# Altium footprint library GZ7_1_x.PcbLib: 61 footprints (part 3 of 4)
Each footprint in its own frame and in the unit in brackets; x right, y up, seen from the top. Pads: shape width x height; smd on the part's side, far side on the other; paste and mask are expansions set on the pad; w line width, h text height; cw(c..) or ccw(c..) is an arc to the next point about the centre after c.
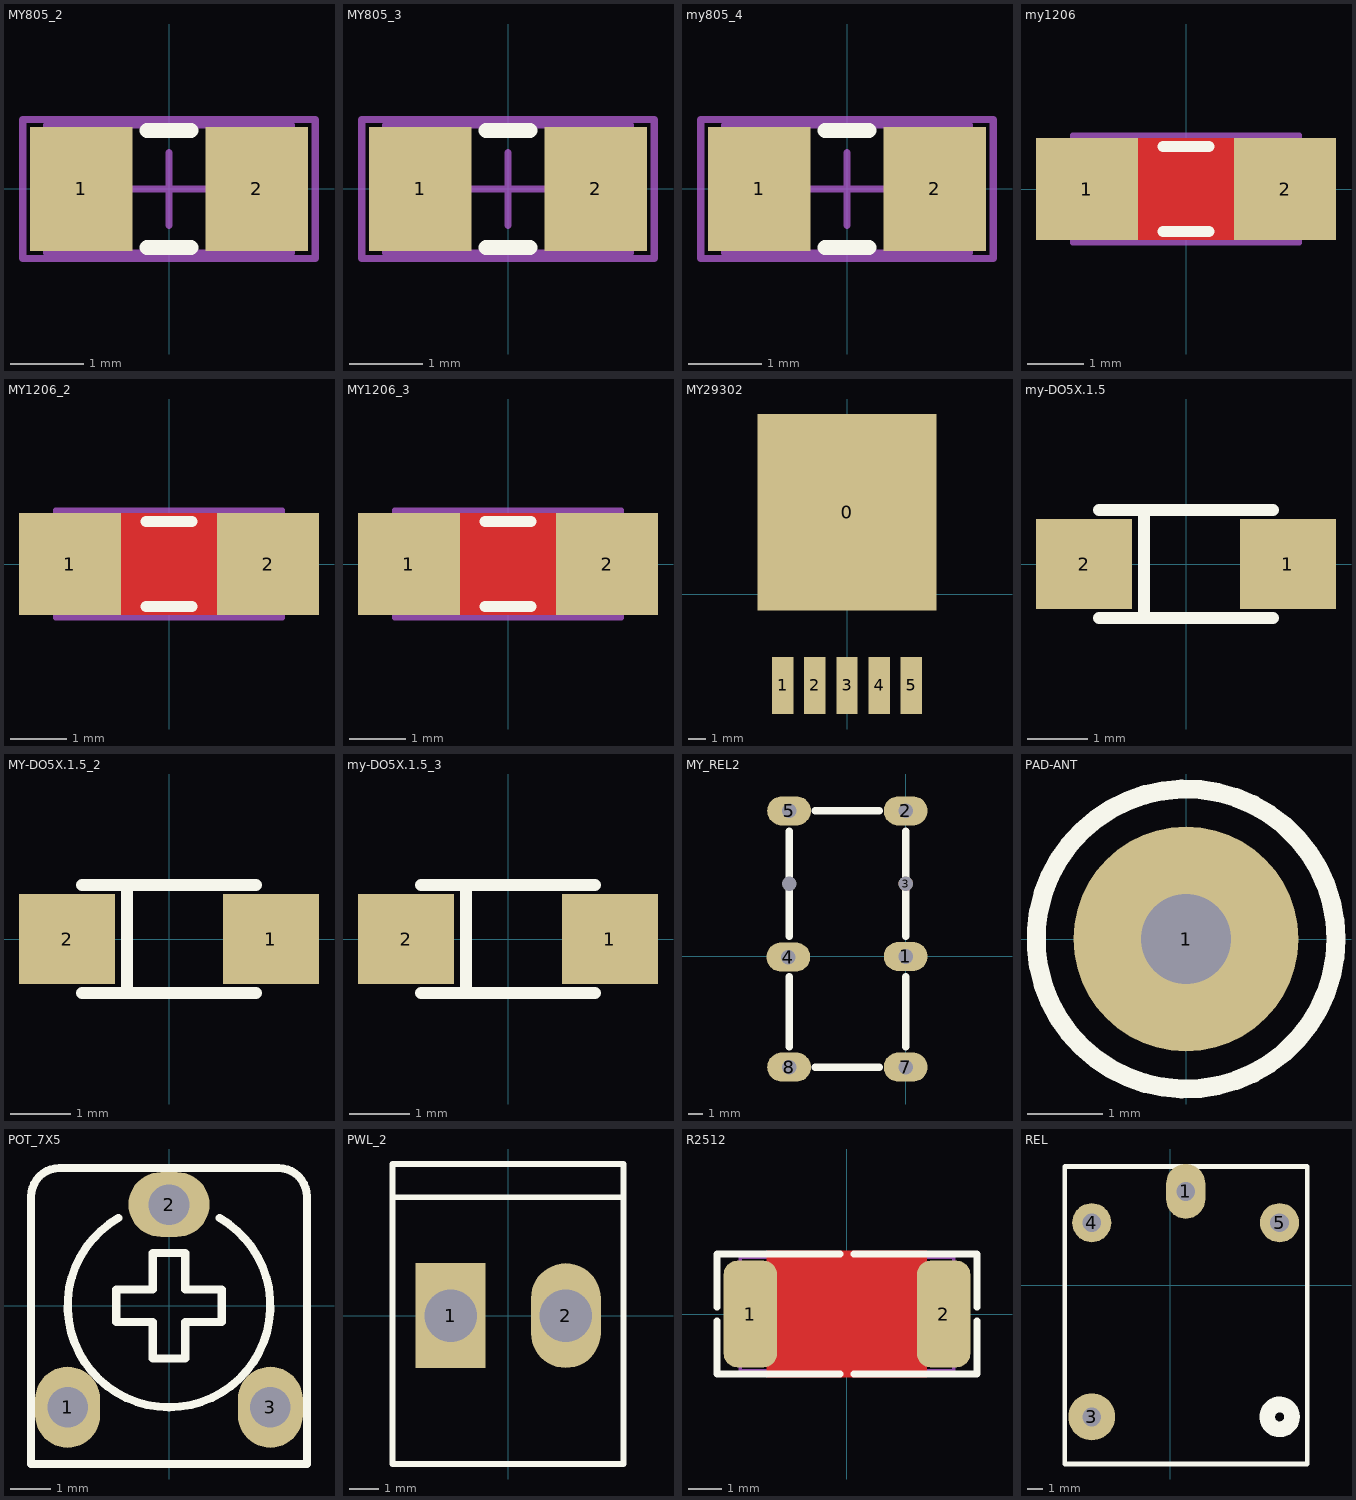
[diagram p2: the footprints below, top view; thin cyan lines are the x and y axes]

## MY805_2 [mm]
pads (2):
  rect 1.4x1.7 smd: 1(-1.2,0) 2(1.2,0)
Top Overlay:
  lines w0.2: -0.3,-0.8 0.3,-0.8 ; -0.3,0.8 0.3,0.8
Mechanical 13:
  lines w0.1: -1.675,-0.875 1.675,-0.875 1.675,0.875 -1.675,0.875 -1.675,-0.875
Mechanical 15:
  lines w0.1: -0.5,0 0.5,0 ; 0,-0.5 0,0.5 ; -2,-0.95 2,-0.95 2,0.95 -2,0.95 -2,-0.95
3D body "User Library-RES_2013-0805.STEP": height 0.77, standoff 0.01, extent -1.15,-0.675 1.15,0.675

## MY805_3 [mm]
pads (2):
  rect 1.4x1.7 smd: 1(-1.2,0) 2(1.2,0)
Top Overlay:
  lines w0.2: -0.3,-0.8 0.3,-0.8 ; -0.3,0.8 0.3,0.8
Mechanical 13:
  lines w0.1: -1.675,-0.875 1.675,-0.875 1.675,0.875 -1.675,0.875 -1.675,-0.875
Mechanical 15:
  lines w0.1: -0.5,0 0.5,0 ; 0,-0.5 0,0.5 ; -2,-0.95 2,-0.95 2,0.95 -2,0.95 -2,-0.95
3D body "User Library-RES_2013-0805.STEP": height 0.77, standoff 0.01, extent -1.15,-0.675 1.15,0.675

## my805_4 [mm]
pads (2):
  rect 1.4x1.7 smd: 1(-1.2,0) 2(1.2,0)
Top Overlay:
  lines w0.2: -0.3,-0.8 0.3,-0.8 ; -0.3,0.8 0.3,0.8
Mechanical 13:
  lines w0.1: -1.675,-0.875 -1.675,0.875 1.675,0.875 1.675,-0.875 -1.675,-0.875
Mechanical 15:
  lines w0.1: -0.5,0 0.5,0 ; 0,-0.5 0,0.5 ; -2,-0.95 -2,0.95 2,0.95 2,-0.95 -2,-0.95
3D body "User Library-RES_2013-0805.STEP": height 0.77, standoff 0.01, extent -1.15,-0.675 1.15,0.675

## my1206 [mm]
height 1.524
pads (2):
  rect 1.8x1.8 smd: 1(-1.75,0) 2(1.75,0)
Top Layer:
  pour cut-out: -1.2,0.9 1.2,0.9 1.2,-0.9 -1.2,-0.9
Top Overlay:
  lines w0.2: -0.4,-0.75 0.4,-0.75 ; -0.4,0.75 0.4,0.75
Mechanical 13:
  lines w0.1: -1.675,-0.875 1.675,-0.875 1.675,0.875 -1.675,0.875 -1.675,-0.875
Mechanical 15:
  lines w0.1: -0.5,0 0.5,0 ; 0,-0.5 0,0.5 ; -2,-0.95 2,-0.95 2,0.95 -2,0.95 -2,-0.95
3D body "end-el-san Co Ltd-R10-1206.STEP": height 0.55, standoff 0, extent -1.6,-0.8 1.6,0.8

## MY1206_2 [mm]
pads (2):
  rect 1.8x1.8 smd: 1(-1.75,0) 2(1.75,0)
Top Layer:
  pour cut-out: -1.2,0.9 1.2,0.9 1.2,-0.9 -1.2,-0.9
Top Overlay:
  lines w0.2: -0.4,-0.75 0.4,-0.75 ; -0.4,0.75 0.4,0.75
Mechanical 13:
  lines w0.1: -1.675,-0.875 -1.675,0.875 1.675,0.875 1.675,-0.875 -1.675,-0.875
Mechanical 15:
  lines w0.1: -0.5,0 0.5,0 ; 0,-0.5 0,0.5 ; -2,-0.95 -2,0.95 2,0.95 2,-0.95 -2,-0.95
3D body "end-el-san Co Ltd-R10-1206.STEP": height 0.55, standoff 0, extent -1.6,-0.8 1.6,0.8

## MY1206_3 [mm]
pads (2):
  rect 1.8x1.8 smd: 1(-1.75,0) 2(1.75,0)
Top Layer:
  pour cut-out: -1.2,0.9 1.2,0.9 1.2,-0.9 -1.2,-0.9
Top Overlay:
  lines w0.2: -0.4,-0.75 0.4,-0.75 ; -0.4,0.75 0.4,0.75
Mechanical 13:
  lines w0.1: -1.675,-0.875 1.675,-0.875 1.675,0.875 -1.675,0.875 -1.675,-0.875
Mechanical 15:
  lines w0.1: -0.5,0 0.5,0 ; 0,-0.5 0,0.5 ; -2,-0.95 2,-0.95 2,0.95 -2,0.95 -2,-0.95
3D body "end-el-san Co Ltd-R10-1206.STEP": height 0.55, standoff 0, extent -1.6,-0.8 1.6,0.8

## MY29302 [mm]
pads (6):
  rect 10x11 smd: 0(0,4.6)
  rect 1.2x3.2 smd: 1(-3.6,-5.1) 2(-1.8,-5.1) 3(0,-5.1) 4(1.8,-5.1) 5(3.6,-5.1)
3D body "MIC29302WU.STEP": height 4.41, standoff -0.14, extent -5.163,-6.42 5.137,8.808

## my-DO5X.1.5 [mm]
height 1.524
pads (2):
  rect 1.6x1.5 smd: 1(1.7,0) 2(-1.7,0)
Top Overlay:
  lines w0.2: -1.45,-0.9 1.45,-0.9 ; -1.45,0.9 1.45,0.9 ; -0.7,-0.9 -0.7,0.9
3D body "User Library-MiniMelf-2.STEP": height 1.6, standoff 0, extent -1.88,-0.8 1.82,0.8

## MY-DO5X.1.5_2 [mm]
pads (2):
  rect 1.6x1.5 smd: 1(1.7,0) 2(-1.7,0)
Top Overlay:
  lines w0.2: -1.45,-0.9 1.45,-0.9 ; -1.45,0.9 1.45,0.9 ; -0.7,-0.9 -0.7,0.9
3D body "User Library-MiniMelf-2.STEP": height 1.6, standoff 0, extent -1.88,-0.8 1.82,0.8

## my-DO5X.1.5_3 [mm]
pads (2):
  rect 1.6x1.5 smd: 1(1.7,0) 2(-1.7,0)
Top Overlay:
  lines w0.2: -1.45,-0.9 1.45,-0.9 ; -1.45,0.9 1.45,0.9 ; -0.7,-0.9 -0.7,0.9
3D body "User Library-MiniMelf-2.STEP": height 1.6, standoff 0, extent -1.88,-0.8 1.82,0.8

## MY_REL2 [mm]
height 1.524
pads (8):
  oval 3x2 hole 1: 1(0,0) 2(0,10) 4(-8.048,-0.044) 5(-8,10) 7(0,-7.6) 8(-8,-7.6)
  round 1 hole 1: 3(0,5)
  round 0 hole 1: 6(-8,5)
Top Overlay:
  lines w0.508: -8,-6.2 -8,-1.4 ; -8,1.4 -8,8.6 ; -6.2,-7.6 -1.8,-7.6 ; -6.2,10 -1.8,10 ; 0,-6.2 0,-1.4 ; 0,1.4 0,8.6
3D body "relays RSM822 6112-85-S012.STEP": height 11.44, standoff -4.69, extent -8.987,-8.849 1.113,12.151

## PAD-ANT [mm]
pads (1):
  round 3 hole 1.2: 1(0,0)
Top Overlay:
  circle w0.254: c0,0 r2
3D body "TEST POINT.step": height 6.51, standoff -2.99, extent -0.5,-0.5 0.5,0.5

## POT_7X5 [mm] "POT, TRIM, 7.5X5.0mm, pitch: 5.0mm"
height 35
pads (3):
  oval 1.6x2 hole 1 mask+0.08: 1(-2.5,-2.5) 3(2.5,-2.5)
  oval 2x1.6 hole 1 mask+0.08: 2(0,2.5)
Top Overlay:
  lines w0.2: -1.25,2.165 ccw(c0,0) 1.25,2.165 ; -3.4,-3.9 -3.4,2.7 cw(c-2.7,2.7) -2.7,3.4 2.7,3.4 cw(c2.7,2.7) 3.4,2.7 3.4,-3.9 -3.4,-3.9 ; -1.3,-0.4 -1.3,0.4 -0.4,0.4 -0.4,1.3 0.4,1.3 0.4,0.4 1.3,0.4 1.3,-0.4 0.4,-0.4 0.4,-1.3 -0.4,-1.3 -0.4,-0.4 -1.3,-0.4
3D body "User Library-Pot - RES_VAR1.STEP": height 7, standoff -3.9, extent -3.25,-3.775 3.25,3.275

## PWL_2 [mm] "Connector; Header; 2 Position"
height 0.001
pads (2):
  rect 2.4x3.6 hole 1.8: 1(-1.98,0)
  oval 2.4x3.6 hole 1.8: 2(1.98,0)
Top Overlay:
  lines w0.2: -3.98,4.064 3.96,4.064 ; -3.98,-5.1 3.96,-5.1 3.96,5.207 -3.98,5.207 -3.98,-5.1
3D body "PWL-2.stp": height 13.5, standoff -4, extent -3.96,-5 3.96,5

## R2512 [mm] "CHIP RESISTOR 1 WATT, 6.4X3.2mm, 2512, 6432"
height 1
pads (2):
  rrect50% 1.6x3.2 smd mask+0.08: 1(-2.9,0) 2(2.9,0)
Top Layer:
  pour cut-out: -2.4,1.9 2.4,1.9 2.4,-1.9 -2.4,-1.9
Top Overlay:
  lines w0.2: -3.9,-0.2 -3.9,-1.8 -0.2,-1.8 ; -3.9,0.2 -3.9,1.8 -0.2,1.8 ; 0.2,-1.8 3.9,-1.8 3.9,-0.2 ; 0.2,1.8 3.9,1.8 3.9,0.2
Mechanical 13:
  lines w0.1: -3.2,-1.7 3.2,-1.7 3.2,1.7 -3.2,1.7 -3.2,-1.7
3D body "User Library-2512 SMD Resistor.step": height 1.6, standoff 0, extent -3.175,-1.5 3.175,1.5

## REL [mm]
pads (4):
  oval 2.5x3.5 hole 1.2 mask+0.2: 1(0.993,6.009)
  round 3 hole 1.2 mask+0.2: 3(-5.007,-8.391)
  round 2.5 hole 1.2 mask+0.2: 4(-5.007,4.009) 5(6.993,4.009)
Top Overlay:
  circle w1: c6.993,-8.391 r0.793
  lines w0.3: -6.725,-11.4 -6.725,7.6 8.75,7.6 8.75,-11.4 -6.725,-11.4
3D body "833H-1C-C-12VDC.STEP": height 15.01, standoff -3.99, extent -6.734,-11.405 8.766,7.595